# Altium footprint library Connector_PinHeader_2.54mm.PcbLib: 278 footprints (part 12 of 18)
Each footprint in its own frame and in the unit in brackets; x right, y up, seen from the top. Pads: shape width x height; smd on the part's side, far side on the other; paste and mask are expansions set on the pad; w line width, h text height; cw(c..) or ccw(c..) is an arc to the next point about the centre after c.
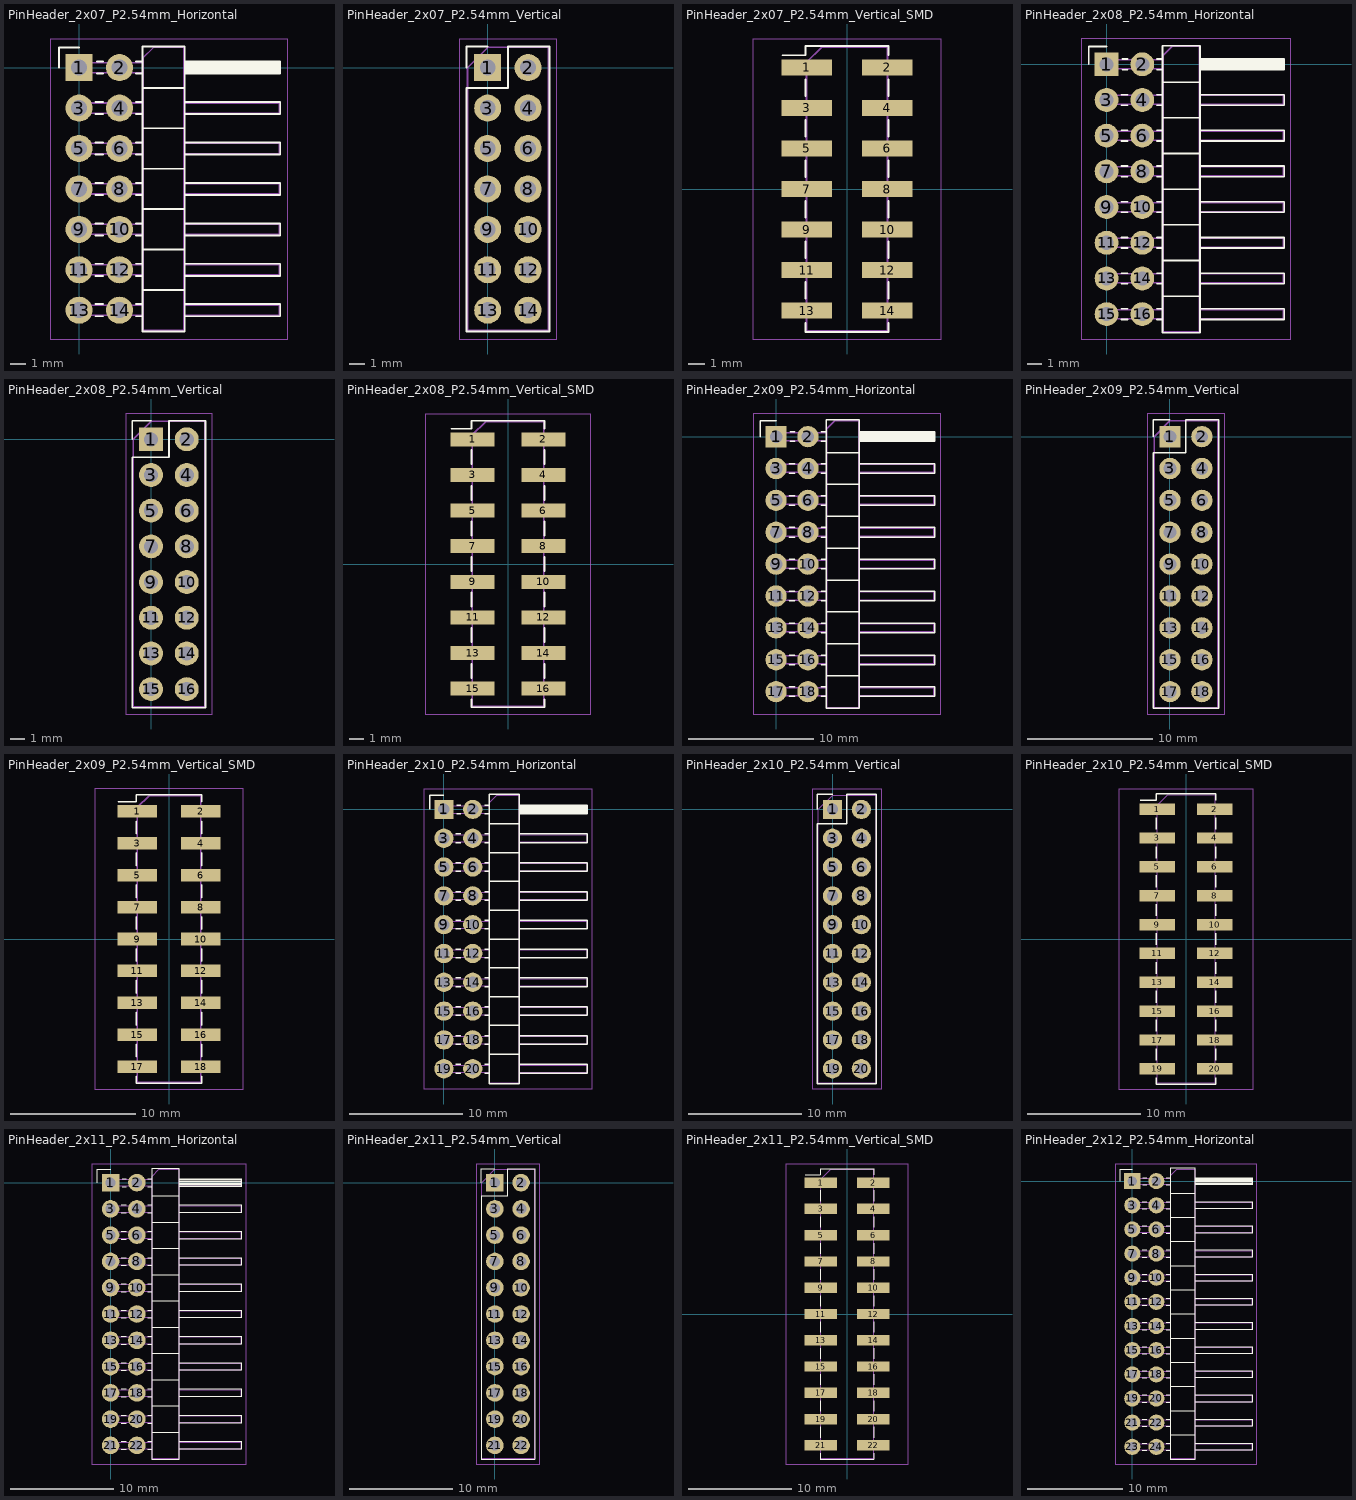
[diagram p11: the footprints below, top view; thin cyan lines are the x and y axes]

## PinHeader_2x07_P2.54mm_Horizontal [mm]
pads (14):
  rect 1.7x1.7 hole 1: 1(0,0)
  rrect100% 1.7x1.7 hole 1: 2(2.54,0) 3(0,-2.54) 4(2.54,-2.54) 5(0,-5.08) 6(2.54,-5.08) 7(0,-7.62) 8(2.54,-7.62) 9(0,-10.16) 10(2.54,-10.16) 11(0,-12.7) 12(2.54,-12.7) 13(0,-15.24) 14(2.54,-15.24)
F.SilkS:
  lines w0.12: -1.27,0 -1.27,1.27 0,1.27 ; 1.043,-15.62 1.497,-15.62 ; 1.043,-14.86 1.497,-14.86 ; 1.043,-13.08 1.497,-13.08 ; 1.043,-12.32 1.497,-12.32 ; 1.043,-10.54 1.497,-10.54 ; 1.043,-9.78 1.497,-9.78 ; 1.043,-8 1.497,-8 ; 1.043,-7.24 1.497,-7.24 ; 1.043,-5.46 1.497,-5.46 ; 1.043,-4.7 1.497,-4.7 ; 1.043,-2.92 1.497,-2.92 ; 1.043,-2.16 1.497,-2.16 ; 1.11,-0.38 1.497,-0.38 ; 1.11,0.38 1.497,0.38 ; 3.583,-15.62 3.98,-15.62 ; 3.583,-14.86 3.98,-14.86 ; 3.583,-13.08 3.98,-13.08 ; 3.583,-12.32 3.98,-12.32 ; 3.583,-10.54 3.98,-10.54 ; 3.583,-9.78 3.98,-9.78 ; 3.583,-8 3.98,-8 ; 3.583,-7.24 3.98,-7.24 ; 3.583,-5.46 3.98,-5.46 ; 3.583,-4.7 3.98,-4.7 ; 3.583,-2.92 3.98,-2.92 ; 3.583,-2.16 3.98,-2.16 ; 3.583,-0.38 3.98,-0.38 ; 3.583,0.38 3.98,0.38 ; 3.98,-13.97 6.64,-13.97 ; 3.98,-11.43 6.64,-11.43 ; 3.98,-8.89 6.64,-8.89 ; 3.98,-6.35 6.64,-6.35 ; 3.98,-3.81 6.64,-3.81 ; 3.98,-1.27 6.64,-1.27 ; 6.64,-15.62 12.64,-15.62 12.64,-14.86 6.64,-14.86 ; 6.64,-13.08 12.64,-13.08 12.64,-12.32 6.64,-12.32 ; 6.64,-10.54 12.64,-10.54 12.64,-9.78 6.64,-9.78 ; 6.64,-8 12.64,-8 12.64,-7.24 6.64,-7.24 ; 6.64,-5.46 12.64,-5.46 12.64,-4.7 6.64,-4.7 ; 6.64,-2.92 12.64,-2.92 12.64,-2.16 6.64,-2.16 ; 6.64,-0.38 12.64,-0.38 12.64,0.38 6.64,0.38 ; 6.64,-0.28 12.64,-0.28 ; 6.64,-0.16 12.64,-0.16 ; 6.64,-0.04 12.64,-0.04 ; 6.64,0.08 12.64,0.08 ; 6.64,0.2 12.64,0.2 ; 6.64,0.32 12.64,0.32 ; 3.98,-16.57 3.98,1.33 6.64,1.33 6.64,-16.57 3.98,-16.57
F.CrtYd:
  lines w0.05: -1.8,-17.05 13.1,-17.05 13.1,1.8 -1.8,1.8 -1.8,-17.05
F.Fab:
  lines w0.1: 4.04,-15.56 -0.32,-15.56 -0.32,-14.92 4.04,-14.92 ; 4.04,-13.02 -0.32,-13.02 -0.32,-12.38 4.04,-12.38 ; 4.04,-10.48 -0.32,-10.48 -0.32,-9.84 4.04,-9.84 ; 4.04,-7.94 -0.32,-7.94 -0.32,-7.3 4.04,-7.3 ; 4.04,-5.4 -0.32,-5.4 -0.32,-4.76 4.04,-4.76 ; 4.04,-2.86 -0.32,-2.86 -0.32,-2.22 4.04,-2.22 ; 4.04,-0.32 -0.32,-0.32 -0.32,0.32 4.04,0.32 ; 6.58,-15.56 12.58,-15.56 12.58,-14.92 6.58,-14.92 ; 6.58,-13.02 12.58,-13.02 12.58,-12.38 6.58,-12.38 ; 6.58,-10.48 12.58,-10.48 12.58,-9.84 6.58,-9.84 ; 6.58,-7.94 12.58,-7.94 12.58,-7.3 6.58,-7.3 ; 6.58,-5.4 12.58,-5.4 12.58,-4.76 6.58,-4.76 ; 6.58,-2.86 12.58,-2.86 12.58,-2.22 6.58,-2.22 ; 6.58,-0.32 12.58,-0.32 12.58,0.32 6.58,0.32 ; 4.04,-16.51 6.58,-16.51 6.58,1.27 4.675,1.27 4.04,0.635 4.04,-16.51
  text "'.Designator'" at 6.15,-11.667 h1

## PinHeader_2x07_P2.54mm_Vertical [mm]
pads (14):
  rect 1.7x1.7 hole 1: 1(0,0)
  rrect100% 1.7x1.7 hole 1: 2(2.54,0) 3(0,-2.54) 4(2.54,-2.54) 5(0,-5.08) 6(2.54,-5.08) 7(0,-7.62) 8(2.54,-7.62) 9(0,-10.16) 10(2.54,-10.16) 11(0,-12.7) 12(2.54,-12.7) 13(0,-15.24) 14(2.54,-15.24)
F.SilkS:
  lines w0.12: -1.33,0 -1.33,1.33 0,1.33 ; -1.33,-16.57 3.87,-16.57 3.87,1.33 1.27,1.33 1.27,-1.27 -1.33,-1.27 -1.33,-16.57
F.CrtYd:
  lines w0.05: -1.8,-17.05 -1.8,1.8 4.35,1.8 4.35,-17.05 -1.8,-17.05
F.Fab:
  lines w0.1: -1.27,-16.51 -1.27,0 0,1.27 3.81,1.27 3.81,-16.51 -1.27,-16.51
  text "'.Designator'" at 2.11,-11.667 h1

## PinHeader_2x07_P2.54mm_Vertical_SMD [mm]
pads (14):
  rect 3.15x1 smd: 1(-2.525,7.62) 2(2.525,7.62) 3(-2.525,5.08) 4(2.525,5.08) 5(-2.525,2.54) 6(2.525,2.54) 7(-2.525,0) 8(2.525,0) 9(-2.525,-2.54) 10(2.525,-2.54) 11(-2.525,-5.08) 12(2.525,-5.08) 13(-2.525,-7.62) 14(2.525,-7.62)
F.SilkS:
  lines w0.12: -4.04,8.38 -2.6,8.38 -2.6,8.95 2.6,8.95 2.6,8.38 ; -2.6,-8.38 -2.6,-8.95 2.6,-8.95 2.6,-8.38 ; -2.6,-6.86 -2.6,-5.84 ; -2.6,-4.32 -2.6,-3.3 ; -2.6,-1.78 -2.6,-0.76 ; -2.6,0.76 -2.6,1.78 ; -2.6,3.3 -2.6,4.32 ; -2.6,5.84 -2.6,6.86 ; 2.6,-6.86 2.6,-5.84 ; 2.6,-4.32 2.6,-3.3 ; 2.6,-1.78 2.6,-0.76 ; 2.6,0.76 2.6,1.78 ; 2.6,3.3 2.6,4.32 ; 2.6,5.84 2.6,6.86
F.CrtYd:
  lines w0.05: -5.9,-9.4 -5.9,9.4 5.9,9.4 5.9,-9.4 -5.9,-9.4
F.Fab:
  lines w0.1: -2.54,-7.94 -3.6,-7.94 -3.6,-7.3 -2.54,-7.3 ; -2.54,-5.4 -3.6,-5.4 -3.6,-4.76 -2.54,-4.76 ; -2.54,-2.86 -3.6,-2.86 -3.6,-2.22 -2.54,-2.22 ; -2.54,-0.32 -3.6,-0.32 -3.6,0.32 -2.54,0.32 ; -2.54,2.22 -3.6,2.22 -3.6,2.86 -2.54,2.86 ; -2.54,4.76 -3.6,4.76 -3.6,5.4 -2.54,5.4 ; -2.54,7.3 -3.6,7.3 -3.6,7.94 -2.54,7.94 ; 2.54,-7.94 3.6,-7.94 3.6,-7.3 2.54,-7.3 ; 2.54,-5.4 3.6,-5.4 3.6,-4.76 2.54,-4.76 ; 2.54,-2.86 3.6,-2.86 3.6,-2.22 2.54,-2.22 ; 2.54,-0.32 3.6,-0.32 3.6,0.32 2.54,0.32 ; 2.54,2.22 3.6,2.22 3.6,2.86 2.54,2.86 ; 2.54,4.76 3.6,4.76 3.6,5.4 2.54,5.4 ; 2.54,7.3 3.6,7.3 3.6,7.94 2.54,7.94 ; -2.54,7.94 -1.59,8.89 2.54,8.89 2.54,-8.89 -2.54,-8.89 -2.54,7.94
  text "'.Designator'" at 0.84,-4.047 h1

## PinHeader_2x08_P2.54mm_Horizontal [mm]
pads (16):
  rect 1.7x1.7 hole 1: 1(0,0)
  rrect100% 1.7x1.7 hole 1: 2(2.54,0) 3(0,-2.54) 4(2.54,-2.54) 5(0,-5.08) 6(2.54,-5.08) 7(0,-7.62) 8(2.54,-7.62) 9(0,-10.16) 10(2.54,-10.16) 11(0,-12.7) 12(2.54,-12.7) 13(0,-15.24) 14(2.54,-15.24) 15(0,-17.78) 16(2.54,-17.78)
F.SilkS:
  lines w0.12: -1.27,0 -1.27,1.27 0,1.27 ; 1.043,-18.16 1.497,-18.16 ; 1.043,-17.4 1.497,-17.4 ; 1.043,-15.62 1.497,-15.62 ; 1.043,-14.86 1.497,-14.86 ; 1.043,-13.08 1.497,-13.08 ; 1.043,-12.32 1.497,-12.32 ; 1.043,-10.54 1.497,-10.54 ; 1.043,-9.78 1.497,-9.78 ; 1.043,-8 1.497,-8 ; 1.043,-7.24 1.497,-7.24 ; 1.043,-5.46 1.497,-5.46 ; 1.043,-4.7 1.497,-4.7 ; 1.043,-2.92 1.497,-2.92 ; 1.043,-2.16 1.497,-2.16 ; 1.11,-0.38 1.497,-0.38 ; 1.11,0.38 1.497,0.38 ; 3.583,-18.16 3.98,-18.16 ; 3.583,-17.4 3.98,-17.4 ; 3.583,-15.62 3.98,-15.62 ; 3.583,-14.86 3.98,-14.86 ; 3.583,-13.08 3.98,-13.08 ; 3.583,-12.32 3.98,-12.32 ; 3.583,-10.54 3.98,-10.54 ; 3.583,-9.78 3.98,-9.78 ; 3.583,-8 3.98,-8 ; 3.583,-7.24 3.98,-7.24 ; 3.583,-5.46 3.98,-5.46 ; 3.583,-4.7 3.98,-4.7 ; 3.583,-2.92 3.98,-2.92 ; 3.583,-2.16 3.98,-2.16 ; 3.583,-0.38 3.98,-0.38 ; 3.583,0.38 3.98,0.38 ; 3.98,-16.51 6.64,-16.51 ; 3.98,-13.97 6.64,-13.97 ; 3.98,-11.43 6.64,-11.43 ; 3.98,-8.89 6.64,-8.89 ; 3.98,-6.35 6.64,-6.35 ; 3.98,-3.81 6.64,-3.81 ; 3.98,-1.27 6.64,-1.27 ; 6.64,-18.16 12.64,-18.16 12.64,-17.4 6.64,-17.4 ; 6.64,-15.62 12.64,-15.62 12.64,-14.86 6.64,-14.86 ; 6.64,-13.08 12.64,-13.08 12.64,-12.32 6.64,-12.32 ; 6.64,-10.54 12.64,-10.54 12.64,-9.78 6.64,-9.78 ; 6.64,-8 12.64,-8 12.64,-7.24 6.64,-7.24 ; 6.64,-5.46 12.64,-5.46 12.64,-4.7 6.64,-4.7 ; 6.64,-2.92 12.64,-2.92 12.64,-2.16 6.64,-2.16 ; 6.64,-0.38 12.64,-0.38 12.64,0.38 6.64,0.38 ; 6.64,-0.28 12.64,-0.28 ; 6.64,-0.16 12.64,-0.16 ; 6.64,-0.04 12.64,-0.04 ; 6.64,0.08 12.64,0.08 ; 6.64,0.2 12.64,0.2 ; 6.64,0.32 12.64,0.32 ; 3.98,-19.11 6.64,-19.11 6.64,1.33 3.98,1.33 3.98,-19.11
F.CrtYd:
  lines w0.05: -1.8,-19.55 13.1,-19.55 13.1,1.8 -1.8,1.8 -1.8,-19.55
F.Fab:
  lines w0.1: 4.04,-18.1 -0.32,-18.1 -0.32,-17.46 4.04,-17.46 ; 4.04,-15.56 -0.32,-15.56 -0.32,-14.92 4.04,-14.92 ; 4.04,-13.02 -0.32,-13.02 -0.32,-12.38 4.04,-12.38 ; 4.04,-10.48 -0.32,-10.48 -0.32,-9.84 4.04,-9.84 ; 4.04,-7.94 -0.32,-7.94 -0.32,-7.3 4.04,-7.3 ; 4.04,-5.4 -0.32,-5.4 -0.32,-4.76 4.04,-4.76 ; 4.04,-2.86 -0.32,-2.86 -0.32,-2.22 4.04,-2.22 ; 4.04,-0.32 -0.32,-0.32 -0.32,0.32 4.04,0.32 ; 6.58,-18.1 12.58,-18.1 12.58,-17.46 6.58,-17.46 ; 6.58,-15.56 12.58,-15.56 12.58,-14.92 6.58,-14.92 ; 6.58,-13.02 12.58,-13.02 12.58,-12.38 6.58,-12.38 ; 6.58,-10.48 12.58,-10.48 12.58,-9.84 6.58,-9.84 ; 6.58,-7.94 12.58,-7.94 12.58,-7.3 6.58,-7.3 ; 6.58,-5.4 12.58,-5.4 12.58,-4.76 6.58,-4.76 ; 6.58,-2.86 12.58,-2.86 12.58,-2.22 6.58,-2.22 ; 6.58,-0.32 12.58,-0.32 12.58,0.32 6.58,0.32 ; 4.04,-19.05 6.58,-19.05 6.58,1.27 4.675,1.27 4.04,0.635 4.04,-19.05
  text "'.Designator'" at 6.15,-12.937 h1

## PinHeader_2x08_P2.54mm_Vertical [mm]
pads (16):
  rect 1.7x1.7 hole 1: 1(0,0)
  rrect100% 1.7x1.7 hole 1: 2(2.54,0) 3(0,-2.54) 4(2.54,-2.54) 5(0,-5.08) 6(2.54,-5.08) 7(0,-7.62) 8(2.54,-7.62) 9(0,-10.16) 10(2.54,-10.16) 11(0,-12.7) 12(2.54,-12.7) 13(0,-15.24) 14(2.54,-15.24) 15(0,-17.78) 16(2.54,-17.78)
F.SilkS:
  lines w0.12: -1.33,0 -1.33,1.33 0,1.33 ; -1.33,-19.11 -1.33,-1.27 1.27,-1.27 1.27,1.33 3.87,1.33 3.87,-19.11 -1.33,-19.11
F.CrtYd:
  lines w0.05: -1.8,-19.55 4.35,-19.55 4.35,1.8 -1.8,1.8 -1.8,-19.55
F.Fab:
  lines w0.1: -1.27,-19.05 3.81,-19.05 3.81,1.27 0,1.27 -1.27,0 -1.27,-19.05
  text "'.Designator'" at 2.11,-12.937 h1

## PinHeader_2x08_P2.54mm_Vertical_SMD [mm]
pads (16):
  rect 3.15x1 smd: 1(-2.525,8.89) 2(2.525,8.89) 3(-2.525,6.35) 4(2.525,6.35) 5(-2.525,3.81) 6(2.525,3.81) 7(-2.525,1.27) 8(2.525,1.27) 9(-2.525,-1.27) 10(2.525,-1.27) 11(-2.525,-3.81) 12(2.525,-3.81) 13(-2.525,-6.35) 14(2.525,-6.35) 15(-2.525,-8.89) 16(2.525,-8.89)
F.SilkS:
  lines w0.12: -4.04,9.65 -2.6,9.65 -2.6,10.22 2.6,10.22 2.6,9.65 ; -2.6,-9.65 -2.6,-10.22 2.6,-10.22 2.6,-9.65 ; -2.6,-8.13 -2.6,-7.11 ; -2.6,-5.59 -2.6,-4.57 ; -2.6,-3.05 -2.6,-2.03 ; -2.6,-0.51 -2.6,0.51 ; -2.6,2.03 -2.6,3.05 ; -2.6,4.57 -2.6,5.59 ; -2.6,7.11 -2.6,8.13 ; 2.6,-8.13 2.6,-7.11 ; 2.6,-5.59 2.6,-4.57 ; 2.6,-3.05 2.6,-2.03 ; 2.6,-0.51 2.6,0.51 ; 2.6,2.03 2.6,3.05 ; 2.6,4.57 2.6,5.59 ; 2.6,7.11 2.6,8.13
F.CrtYd:
  lines w0.05: -5.9,-10.7 -5.9,10.7 5.9,10.7 5.9,-10.7 -5.9,-10.7
F.Fab:
  lines w0.1: -2.54,-9.21 -3.6,-9.21 -3.6,-8.57 -2.54,-8.57 ; -2.54,-6.67 -3.6,-6.67 -3.6,-6.03 -2.54,-6.03 ; -2.54,-4.13 -3.6,-4.13 -3.6,-3.49 -2.54,-3.49 ; -2.54,-1.59 -3.6,-1.59 -3.6,-0.95 -2.54,-0.95 ; -2.54,0.95 -3.6,0.95 -3.6,1.59 -2.54,1.59 ; -2.54,3.49 -3.6,3.49 -3.6,4.13 -2.54,4.13 ; -2.54,6.03 -3.6,6.03 -3.6,6.67 -2.54,6.67 ; -2.54,8.57 -3.6,8.57 -3.6,9.21 -2.54,9.21 ; 2.54,-9.21 3.6,-9.21 3.6,-8.57 2.54,-8.57 ; 2.54,-6.67 3.6,-6.67 3.6,-6.03 2.54,-6.03 ; 2.54,-4.13 3.6,-4.13 3.6,-3.49 2.54,-3.49 ; 2.54,-1.59 3.6,-1.59 3.6,-0.95 2.54,-0.95 ; 2.54,0.95 3.6,0.95 3.6,1.59 2.54,1.59 ; 2.54,3.49 3.6,3.49 3.6,4.13 2.54,4.13 ; 2.54,6.03 3.6,6.03 3.6,6.67 2.54,6.67 ; 2.54,8.57 3.6,8.57 3.6,9.21 2.54,9.21 ; -2.54,9.21 -1.59,10.16 2.54,10.16 2.54,-10.16 -2.54,-10.16 -2.54,9.21
  text "'.Designator'" at 0.84,-4.047 h1

## PinHeader_2x09_P2.54mm_Horizontal [mm]
pads (18):
  rect 1.7x1.7 hole 1: 1(0,0)
  rrect100% 1.7x1.7 hole 1: 2(2.54,0) 3(0,-2.54) 4(2.54,-2.54) 5(0,-5.08) 6(2.54,-5.08) 7(0,-7.62) 8(2.54,-7.62) 9(0,-10.16) 10(2.54,-10.16) 11(0,-12.7) 12(2.54,-12.7) 13(0,-15.24) 14(2.54,-15.24) 15(0,-17.78) 16(2.54,-17.78) 17(0,-20.32) 18(2.54,-20.32)
F.SilkS:
  lines w0.12: -1.27,0 -1.27,1.27 0,1.27 ; 1.043,-20.7 1.497,-20.7 ; 1.043,-19.94 1.497,-19.94 ; 1.043,-18.16 1.497,-18.16 ; 1.043,-17.4 1.497,-17.4 ; 1.043,-15.62 1.497,-15.62 ; 1.043,-14.86 1.497,-14.86 ; 1.043,-13.08 1.497,-13.08 ; 1.043,-12.32 1.497,-12.32 ; 1.043,-10.54 1.497,-10.54 ; 1.043,-9.78 1.497,-9.78 ; 1.043,-8 1.497,-8 ; 1.043,-7.24 1.497,-7.24 ; 1.043,-5.46 1.497,-5.46 ; 1.043,-4.7 1.497,-4.7 ; 1.043,-2.92 1.497,-2.92 ; 1.043,-2.16 1.497,-2.16 ; 1.11,-0.38 1.497,-0.38 ; 1.11,0.38 1.497,0.38 ; 3.583,-20.7 3.98,-20.7 ; 3.583,-19.94 3.98,-19.94 ; 3.583,-18.16 3.98,-18.16 ; 3.583,-17.4 3.98,-17.4 ; 3.583,-15.62 3.98,-15.62 ; 3.583,-14.86 3.98,-14.86 ; 3.583,-13.08 3.98,-13.08 ; 3.583,-12.32 3.98,-12.32 ; 3.583,-10.54 3.98,-10.54 ; 3.583,-9.78 3.98,-9.78 ; 3.583,-8 3.98,-8 ; 3.583,-7.24 3.98,-7.24 ; 3.583,-5.46 3.98,-5.46 ; 3.583,-4.7 3.98,-4.7 ; 3.583,-2.92 3.98,-2.92 ; 3.583,-2.16 3.98,-2.16 ; 3.583,-0.38 3.98,-0.38 ; 3.583,0.38 3.98,0.38 ; 3.98,-19.05 6.64,-19.05 ; 3.98,-16.51 6.64,-16.51 ; 3.98,-13.97 6.64,-13.97 ; 3.98,-11.43 6.64,-11.43 ; 3.98,-8.89 6.64,-8.89 ; 3.98,-6.35 6.64,-6.35 ; 3.98,-3.81 6.64,-3.81 ; 3.98,-1.27 6.64,-1.27 ; 6.64,-20.7 12.64,-20.7 12.64,-19.94 6.64,-19.94 ; 6.64,-18.16 12.64,-18.16 12.64,-17.4 6.64,-17.4 ; 6.64,-15.62 12.64,-15.62 12.64,-14.86 6.64,-14.86 ; 6.64,-13.08 12.64,-13.08 12.64,-12.32 6.64,-12.32 ; 6.64,-10.54 12.64,-10.54 12.64,-9.78 6.64,-9.78 ; 6.64,-8 12.64,-8 12.64,-7.24 6.64,-7.24 ; 6.64,-5.46 12.64,-5.46 12.64,-4.7 6.64,-4.7 ; 6.64,-2.92 12.64,-2.92 12.64,-2.16 6.64,-2.16 ; 6.64,-0.38 12.64,-0.38 12.64,0.38 6.64,0.38 ; 6.64,-0.28 12.64,-0.28 ; 6.64,-0.16 12.64,-0.16 ; 6.64,-0.04 12.64,-0.04 ; 6.64,0.08 12.64,0.08 ; 6.64,0.2 12.64,0.2 ; 6.64,0.32 12.64,0.32 ; 3.98,-21.65 3.98,1.33 6.64,1.33 6.64,-21.65 3.98,-21.65
F.CrtYd:
  lines w0.05: -1.8,-22.1 13.1,-22.1 13.1,1.8 -1.8,1.8 -1.8,-22.1
F.Fab:
  lines w0.1: 4.04,-20.64 -0.32,-20.64 -0.32,-20 4.04,-20 ; 4.04,-18.1 -0.32,-18.1 -0.32,-17.46 4.04,-17.46 ; 4.04,-15.56 -0.32,-15.56 -0.32,-14.92 4.04,-14.92 ; 4.04,-13.02 -0.32,-13.02 -0.32,-12.38 4.04,-12.38 ; 4.04,-10.48 -0.32,-10.48 -0.32,-9.84 4.04,-9.84 ; 4.04,-7.94 -0.32,-7.94 -0.32,-7.3 4.04,-7.3 ; 4.04,-5.4 -0.32,-5.4 -0.32,-4.76 4.04,-4.76 ; 4.04,-2.86 -0.32,-2.86 -0.32,-2.22 4.04,-2.22 ; 4.04,-0.32 -0.32,-0.32 -0.32,0.32 4.04,0.32 ; 6.58,-20.64 12.58,-20.64 12.58,-20 6.58,-20 ; 6.58,-18.1 12.58,-18.1 12.58,-17.46 6.58,-17.46 ; 6.58,-15.56 12.58,-15.56 12.58,-14.92 6.58,-14.92 ; 6.58,-13.02 12.58,-13.02 12.58,-12.38 6.58,-12.38 ; 6.58,-10.48 12.58,-10.48 12.58,-9.84 6.58,-9.84 ; 6.58,-7.94 12.58,-7.94 12.58,-7.3 6.58,-7.3 ; 6.58,-5.4 12.58,-5.4 12.58,-4.76 6.58,-4.76 ; 6.58,-2.86 12.58,-2.86 12.58,-2.22 6.58,-2.22 ; 6.58,-0.32 12.58,-0.32 12.58,0.32 6.58,0.32 ; 4.04,-21.59 4.04,0.635 4.675,1.27 6.58,1.27 6.58,-21.59 4.04,-21.59
  text "'.Designator'" at 6.15,-14.207 h1

## PinHeader_2x09_P2.54mm_Vertical [mm]
pads (18):
  rect 1.7x1.7 hole 1: 1(0,0)
  rrect100% 1.7x1.7 hole 1: 2(2.54,0) 3(0,-2.54) 4(2.54,-2.54) 5(0,-5.08) 6(2.54,-5.08) 7(0,-7.62) 8(2.54,-7.62) 9(0,-10.16) 10(2.54,-10.16) 11(0,-12.7) 12(2.54,-12.7) 13(0,-15.24) 14(2.54,-15.24) 15(0,-17.78) 16(2.54,-17.78) 17(0,-20.32) 18(2.54,-20.32)
F.SilkS:
  lines w0.12: -1.33,0 -1.33,1.33 0,1.33 ; -1.33,-21.65 3.87,-21.65 3.87,1.33 1.27,1.33 1.27,-1.27 -1.33,-1.27 -1.33,-21.65
F.CrtYd:
  lines w0.05: -1.8,-22.1 4.35,-22.1 4.35,1.8 -1.8,1.8 -1.8,-22.1
F.Fab:
  lines w0.1: -1.27,-21.59 -1.27,0 0,1.27 3.81,1.27 3.81,-21.59 -1.27,-21.59
  text "'.Designator'" at 2.11,-14.207 h1

## PinHeader_2x09_P2.54mm_Vertical_SMD [mm]
pads (18):
  rect 3.15x1 smd: 1(-2.525,10.16) 2(2.525,10.16) 3(-2.525,7.62) 4(2.525,7.62) 5(-2.525,5.08) 6(2.525,5.08) 7(-2.525,2.54) 8(2.525,2.54) 9(-2.525,0) 10(2.525,0) 11(-2.525,-2.54) 12(2.525,-2.54) 13(-2.525,-5.08) 14(2.525,-5.08) 15(-2.525,-7.62) 16(2.525,-7.62) 17(-2.525,-10.16) 18(2.525,-10.16)
F.SilkS:
  lines w0.12: -4.04,10.92 -2.6,10.92 -2.6,11.49 2.6,11.49 2.6,10.92 ; -2.6,-10.92 -2.6,-11.49 2.6,-11.49 2.6,-10.92 ; -2.6,-9.4 -2.6,-8.38 ; -2.6,-6.86 -2.6,-5.84 ; -2.6,-4.32 -2.6,-3.3 ; -2.6,-1.78 -2.6,-0.76 ; -2.6,0.76 -2.6,1.78 ; -2.6,3.3 -2.6,4.32 ; -2.6,5.84 -2.6,6.86 ; -2.6,8.38 -2.6,9.4 ; 2.6,-9.4 2.6,-8.38 ; 2.6,-6.86 2.6,-5.84 ; 2.6,-4.32 2.6,-3.3 ; 2.6,-1.78 2.6,-0.76 ; 2.6,0.76 2.6,1.78 ; 2.6,3.3 2.6,4.32 ; 2.6,5.84 2.6,6.86 ; 2.6,8.38 2.6,9.4
F.CrtYd:
  lines w0.05: -5.9,-11.95 -5.9,11.95 5.9,11.95 5.9,-11.95 -5.9,-11.95
F.Fab:
  lines w0.1: -2.54,-10.48 -3.6,-10.48 -3.6,-9.84 -2.54,-9.84 ; -2.54,-7.94 -3.6,-7.94 -3.6,-7.3 -2.54,-7.3 ; -2.54,-5.4 -3.6,-5.4 -3.6,-4.76 -2.54,-4.76 ; -2.54,-2.86 -3.6,-2.86 -3.6,-2.22 -2.54,-2.22 ; -2.54,-0.32 -3.6,-0.32 -3.6,0.32 -2.54,0.32 ; -2.54,2.22 -3.6,2.22 -3.6,2.86 -2.54,2.86 ; -2.54,4.76 -3.6,4.76 -3.6,5.4 -2.54,5.4 ; -2.54,7.3 -3.6,7.3 -3.6,7.94 -2.54,7.94 ; -2.54,9.84 -3.6,9.84 -3.6,10.48 -2.54,10.48 ; 2.54,-10.48 3.6,-10.48 3.6,-9.84 2.54,-9.84 ; 2.54,-7.94 3.6,-7.94 3.6,-7.3 2.54,-7.3 ; 2.54,-5.4 3.6,-5.4 3.6,-4.76 2.54,-4.76 ; 2.54,-2.86 3.6,-2.86 3.6,-2.22 2.54,-2.22 ; 2.54,-0.32 3.6,-0.32 3.6,0.32 2.54,0.32 ; 2.54,2.22 3.6,2.22 3.6,2.86 2.54,2.86 ; 2.54,4.76 3.6,4.76 3.6,5.4 2.54,5.4 ; 2.54,7.3 3.6,7.3 3.6,7.94 2.54,7.94 ; 2.54,9.84 3.6,9.84 3.6,10.48 2.54,10.48 ; -2.54,10.48 -1.59,11.43 2.54,11.43 2.54,-11.43 -2.54,-11.43 -2.54,10.48
  text "'.Designator'" at 0.84,-4.047 h1

## PinHeader_2x10_P2.54mm_Horizontal [mm]
pads (20):
  rect 1.7x1.7 hole 1: 1(0,0)
  rrect100% 1.7x1.7 hole 1: 2(2.54,0) 3(0,-2.54) 4(2.54,-2.54) 5(0,-5.08) 6(2.54,-5.08) 7(0,-7.62) 8(2.54,-7.62) 9(0,-10.16) 10(2.54,-10.16) 11(0,-12.7) 12(2.54,-12.7) 13(0,-15.24) 14(2.54,-15.24) 15(0,-17.78) 16(2.54,-17.78) 17(0,-20.32) 18(2.54,-20.32) 19(0,-22.86) 20(2.54,-22.86)
F.SilkS:
  lines w0.12: -1.27,0 -1.27,1.27 0,1.27 ; 1.043,-23.24 1.497,-23.24 ; 1.043,-22.48 1.497,-22.48 ; 1.043,-20.7 1.497,-20.7 ; 1.043,-19.94 1.497,-19.94 ; 1.043,-18.16 1.497,-18.16 ; 1.043,-17.4 1.497,-17.4 ; 1.043,-15.62 1.497,-15.62 ; 1.043,-14.86 1.497,-14.86 ; 1.043,-13.08 1.497,-13.08 ; 1.043,-12.32 1.497,-12.32 ; 1.043,-10.54 1.497,-10.54 ; 1.043,-9.78 1.497,-9.78 ; 1.043,-8 1.497,-8 ; 1.043,-7.24 1.497,-7.24 ; 1.043,-5.46 1.497,-5.46 ; 1.043,-4.7 1.497,-4.7 ; 1.043,-2.92 1.497,-2.92 ; 1.043,-2.16 1.497,-2.16 ; 1.11,-0.38 1.497,-0.38 ; 1.11,0.38 1.497,0.38 ; 3.583,-23.24 3.98,-23.24 ; 3.583,-22.48 3.98,-22.48 ; 3.583,-20.7 3.98,-20.7 ; 3.583,-19.94 3.98,-19.94 ; 3.583,-18.16 3.98,-18.16 ; 3.583,-17.4 3.98,-17.4 ; 3.583,-15.62 3.98,-15.62 ; 3.583,-14.86 3.98,-14.86 ; 3.583,-13.08 3.98,-13.08 ; 3.583,-12.32 3.98,-12.32 ; 3.583,-10.54 3.98,-10.54 ; 3.583,-9.78 3.98,-9.78 ; 3.583,-8 3.98,-8 ; 3.583,-7.24 3.98,-7.24 ; 3.583,-5.46 3.98,-5.46 ; 3.583,-4.7 3.98,-4.7 ; 3.583,-2.92 3.98,-2.92 ; 3.583,-2.16 3.98,-2.16 ; 3.583,-0.38 3.98,-0.38 ; 3.583,0.38 3.98,0.38 ; 3.98,-21.59 6.64,-21.59 ; 3.98,-19.05 6.64,-19.05 ; 3.98,-16.51 6.64,-16.51 ; 3.98,-13.97 6.64,-13.97 ; 3.98,-11.43 6.64,-11.43 ; 3.98,-8.89 6.64,-8.89 ; 3.98,-6.35 6.64,-6.35 ; 3.98,-3.81 6.64,-3.81 ; 3.98,-1.27 6.64,-1.27 ; 6.64,-23.24 12.64,-23.24 12.64,-22.48 6.64,-22.48 ; 6.64,-20.7 12.64,-20.7 12.64,-19.94 6.64,-19.94 ; 6.64,-18.16 12.64,-18.16 12.64,-17.4 6.64,-17.4 ; 6.64,-15.62 12.64,-15.62 12.64,-14.86 6.64,-14.86 ; 6.64,-13.08 12.64,-13.08 12.64,-12.32 6.64,-12.32 ; 6.64,-10.54 12.64,-10.54 12.64,-9.78 6.64,-9.78 ; 6.64,-8 12.64,-8 12.64,-7.24 6.64,-7.24 ; 6.64,-5.46 12.64,-5.46 12.64,-4.7 6.64,-4.7 ; 6.64,-2.92 12.64,-2.92 12.64,-2.16 6.64,-2.16 ; 6.64,-0.38 12.64,-0.38 12.64,0.38 6.64,0.38 ; 6.64,-0.28 12.64,-0.28 ; 6.64,-0.16 12.64,-0.16 ; 6.64,-0.04 12.64,-0.04 ; 6.64,0.08 12.64,0.08 ; 6.64,0.2 12.64,0.2 ; 6.64,0.32 12.64,0.32 ; 3.98,-24.19 6.64,-24.19 6.64,1.33 3.98,1.33 3.98,-24.19
F.CrtYd:
  lines w0.05: -1.8,-24.65 13.1,-24.65 13.1,1.8 -1.8,1.8 -1.8,-24.65
F.Fab:
  lines w0.1: 4.04,-23.18 -0.32,-23.18 -0.32,-22.54 4.04,-22.54 ; 4.04,-20.64 -0.32,-20.64 -0.32,-20 4.04,-20 ; 4.04,-18.1 -0.32,-18.1 -0.32,-17.46 4.04,-17.46 ; 4.04,-15.56 -0.32,-15.56 -0.32,-14.92 4.04,-14.92 ; 4.04,-13.02 -0.32,-13.02 -0.32,-12.38 4.04,-12.38 ; 4.04,-10.48 -0.32,-10.48 -0.32,-9.84 4.04,-9.84 ; 4.04,-7.94 -0.32,-7.94 -0.32,-7.3 4.04,-7.3 ; 4.04,-5.4 -0.32,-5.4 -0.32,-4.76 4.04,-4.76 ; 4.04,-2.86 -0.32,-2.86 -0.32,-2.22 4.04,-2.22 ; 4.04,-0.32 -0.32,-0.32 -0.32,0.32 4.04,0.32 ; 6.58,-23.18 12.58,-23.18 12.58,-22.54 6.58,-22.54 ; 6.58,-20.64 12.58,-20.64 12.58,-20 6.58,-20 ; 6.58,-18.1 12.58,-18.1 12.58,-17.46 6.58,-17.46 ; 6.58,-15.56 12.58,-15.56 12.58,-14.92 6.58,-14.92 ; 6.58,-13.02 12.58,-13.02 12.58,-12.38 6.58,-12.38 ; 6.58,-10.48 12.58,-10.48 12.58,-9.84 6.58,-9.84 ; 6.58,-7.94 12.58,-7.94 12.58,-7.3 6.58,-7.3 ; 6.58,-5.4 12.58,-5.4 12.58,-4.76 6.58,-4.76 ; 6.58,-2.86 12.58,-2.86 12.58,-2.22 6.58,-2.22 ; 6.58,-0.32 12.58,-0.32 12.58,0.32 6.58,0.32 ; 4.04,-24.13 4.04,0.635 4.675,1.27 6.58,1.27 6.58,-24.13 4.04,-24.13
  text "'.Designator'" at 6.15,-15.477 h1

## PinHeader_2x10_P2.54mm_Vertical [mm]
pads (20):
  rect 1.7x1.7 hole 1: 1(0,0)
  rrect100% 1.7x1.7 hole 1: 2(2.54,0) 3(0,-2.54) 4(2.54,-2.54) 5(0,-5.08) 6(2.54,-5.08) 7(0,-7.62) 8(2.54,-7.62) 9(0,-10.16) 10(2.54,-10.16) 11(0,-12.7) 12(2.54,-12.7) 13(0,-15.24) 14(2.54,-15.24) 15(0,-17.78) 16(2.54,-17.78) 17(0,-20.32) 18(2.54,-20.32) 19(0,-22.86) 20(2.54,-22.86)
F.SilkS:
  lines w0.12: -1.33,0 -1.33,1.33 0,1.33 ; -1.33,-24.19 3.87,-24.19 3.87,1.33 1.27,1.33 1.27,-1.27 -1.33,-1.27 -1.33,-24.19
F.CrtYd:
  lines w0.05: -1.8,-24.65 -1.8,1.8 4.35,1.8 4.35,-24.65 -1.8,-24.65
F.Fab:
  lines w0.1: -1.27,-24.13 -1.27,0 0,1.27 3.81,1.27 3.81,-24.13 -1.27,-24.13
  text "'.Designator'" at 2.11,-15.477 h1

## PinHeader_2x10_P2.54mm_Vertical_SMD [mm]
pads (20):
  rect 3.15x1 smd: 1(-2.525,11.43) 2(2.525,11.43) 3(-2.525,8.89) 4(2.525,8.89) 5(-2.525,6.35) 6(2.525,6.35) 7(-2.525,3.81) 8(2.525,3.81) 9(-2.525,1.27) 10(2.525,1.27) 11(-2.525,-1.27) 12(2.525,-1.27) 13(-2.525,-3.81) 14(2.525,-3.81) 15(-2.525,-6.35) 16(2.525,-6.35) 17(-2.525,-8.89) 18(2.525,-8.89) 19(-2.525,-11.43) 20(2.525,-11.43)
F.SilkS:
  lines w0.12: -4.04,12.19 -2.6,12.19 -2.6,12.76 2.6,12.76 2.6,12.19 ; -2.6,-12.19 -2.6,-12.76 2.6,-12.76 2.6,-12.19 ; -2.6,-10.67 -2.6,-9.65 ; -2.6,-8.13 -2.6,-7.11 ; -2.6,-5.59 -2.6,-4.57 ; -2.6,-3.05 -2.6,-2.03 ; -2.6,-0.51 -2.6,0.51 ; -2.6,2.03 -2.6,3.05 ; -2.6,4.57 -2.6,5.59 ; -2.6,7.11 -2.6,8.13 ; -2.6,9.65 -2.6,10.67 ; 2.6,-10.67 2.6,-9.65 ; 2.6,-8.13 2.6,-7.11 ; 2.6,-5.59 2.6,-4.57 ; 2.6,-3.05 2.6,-2.03 ; 2.6,-0.51 2.6,0.51 ; 2.6,2.03 2.6,3.05 ; 2.6,4.57 2.6,5.59 ; 2.6,7.11 2.6,8.13 ; 2.6,9.65 2.6,10.67
F.CrtYd:
  lines w0.05: -5.9,-13.2 5.9,-13.2 5.9,13.2 -5.9,13.2 -5.9,-13.2
F.Fab:
  lines w0.1: -2.54,-11.75 -3.6,-11.75 -3.6,-11.11 -2.54,-11.11 ; -2.54,-9.21 -3.6,-9.21 -3.6,-8.57 -2.54,-8.57 ; -2.54,-6.67 -3.6,-6.67 -3.6,-6.03 -2.54,-6.03 ; -2.54,-4.13 -3.6,-4.13 -3.6,-3.49 -2.54,-3.49 ; -2.54,-1.59 -3.6,-1.59 -3.6,-0.95 -2.54,-0.95 ; -2.54,0.95 -3.6,0.95 -3.6,1.59 -2.54,1.59 ; -2.54,3.49 -3.6,3.49 -3.6,4.13 -2.54,4.13 ; -2.54,6.03 -3.6,6.03 -3.6,6.67 -2.54,6.67 ; -2.54,8.57 -3.6,8.57 -3.6,9.21 -2.54,9.21 ; -2.54,11.11 -3.6,11.11 -3.6,11.75 -2.54,11.75 ; 2.54,-11.75 3.6,-11.75 3.6,-11.11 2.54,-11.11 ; 2.54,-9.21 3.6,-9.21 3.6,-8.57 2.54,-8.57 ; 2.54,-6.67 3.6,-6.67 3.6,-6.03 2.54,-6.03 ; 2.54,-4.13 3.6,-4.13 3.6,-3.49 2.54,-3.49 ; 2.54,-1.59 3.6,-1.59 3.6,-0.95 2.54,-0.95 ; 2.54,0.95 3.6,0.95 3.6,1.59 2.54,1.59 ; 2.54,3.49 3.6,3.49 3.6,4.13 2.54,4.13 ; 2.54,6.03 3.6,6.03 3.6,6.67 2.54,6.67 ; 2.54,8.57 3.6,8.57 3.6,9.21 2.54,9.21 ; 2.54,11.11 3.6,11.11 3.6,11.75 2.54,11.75 ; -2.54,11.75 -1.59,12.7 2.54,12.7 2.54,-12.7 -2.54,-12.7 -2.54,11.75
  text "'.Designator'" at 0.84,-4.047 h1

## PinHeader_2x11_P2.54mm_Horizontal [mm]
pads (22):
  rect 1.7x1.7 hole 1: 1(0,0)
  rrect100% 1.7x1.7 hole 1: 2(2.54,0) 3(0,-2.54) 4(2.54,-2.54) 5(0,-5.08) 6(2.54,-5.08) 7(0,-7.62) 8(2.54,-7.62) 9(0,-10.16) 10(2.54,-10.16) 11(0,-12.7) 12(2.54,-12.7) 13(0,-15.24) 14(2.54,-15.24) 15(0,-17.78) 16(2.54,-17.78) 17(0,-20.32) 18(2.54,-20.32) 19(0,-22.86) 20(2.54,-22.86) 21(0,-25.4) 22(2.54,-25.4)
F.SilkS:
  lines w0.12: -1.27,0 -1.27,1.27 0,1.27 ; 1.043,-25.78 1.497,-25.78 ; 1.043,-25.02 1.497,-25.02 ; 1.043,-23.24 1.497,-23.24 ; 1.043,-22.48 1.497,-22.48 ; 1.043,-20.7 1.497,-20.7 ; 1.043,-19.94 1.497,-19.94 ; 1.043,-18.16 1.497,-18.16 ; 1.043,-17.4 1.497,-17.4 ; 1.043,-15.62 1.497,-15.62 ; 1.043,-14.86 1.497,-14.86 ; 1.043,-13.08 1.497,-13.08 ; 1.043,-12.32 1.497,-12.32 ; 1.043,-10.54 1.497,-10.54 ; 1.043,-9.78 1.497,-9.78 ; 1.043,-8 1.497,-8 ; 1.043,-7.24 1.497,-7.24 ; 1.043,-5.46 1.497,-5.46 ; 1.043,-4.7 1.497,-4.7 ; 1.043,-2.92 1.497,-2.92 ; 1.043,-2.16 1.497,-2.16 ; 1.11,-0.38 1.497,-0.38 ; 1.11,0.38 1.497,0.38 ; 3.583,-25.78 3.98,-25.78 ; 3.583,-25.02 3.98,-25.02 ; 3.583,-23.24 3.98,-23.24 ; 3.583,-22.48 3.98,-22.48 ; 3.583,-20.7 3.98,-20.7 ; 3.583,-19.94 3.98,-19.94 ; 3.583,-18.16 3.98,-18.16 ; 3.583,-17.4 3.98,-17.4 ; 3.583,-15.62 3.98,-15.62 ; 3.583,-14.86 3.98,-14.86 ; 3.583,-13.08 3.98,-13.08 ; 3.583,-12.32 3.98,-12.32 ; 3.583,-10.54 3.98,-10.54 ; 3.583,-9.78 3.98,-9.78 ; 3.583,-8 3.98,-8 ; 3.583,-7.24 3.98,-7.24 ; 3.583,-5.46 3.98,-5.46 ; 3.583,-4.7 3.98,-4.7 ; 3.583,-2.92 3.98,-2.92 ; 3.583,-2.16 3.98,-2.16 ; 3.583,-0.38 3.98,-0.38 ; 3.583,0.38 3.98,0.38 ; 3.98,-24.13 6.64,-24.13 ; 3.98,-21.59 6.64,-21.59 ; 3.98,-19.05 6.64,-19.05 ; 3.98,-16.51 6.64,-16.51 ; 3.98,-13.97 6.64,-13.97 ; 3.98,-11.43 6.64,-11.43 ; 3.98,-8.89 6.64,-8.89 ; 3.98,-6.35 6.64,-6.35 ; 3.98,-3.81 6.64,-3.81 ; 3.98,-1.27 6.64,-1.27 ; 6.64,-25.78 12.64,-25.78 12.64,-25.02 6.64,-25.02 ; 6.64,-23.24 12.64,-23.24 12.64,-22.48 6.64,-22.48 ; 6.64,-20.7 12.64,-20.7 12.64,-19.94 6.64,-19.94 ; 6.64,-18.16 12.64,-18.16 12.64,-17.4 6.64,-17.4 ; 6.64,-15.62 12.64,-15.62 12.64,-14.86 6.64,-14.86 ; 6.64,-13.08 12.64,-13.08 12.64,-12.32 6.64,-12.32 ; 6.64,-10.54 12.64,-10.54 12.64,-9.78 6.64,-9.78 ; 6.64,-8 12.64,-8 12.64,-7.24 6.64,-7.24 ; 6.64,-5.46 12.64,-5.46 12.64,-4.7 6.64,-4.7 ; 6.64,-2.92 12.64,-2.92 12.64,-2.16 6.64,-2.16 ; 6.64,-0.38 12.64,-0.38 12.64,0.38 6.64,0.38 ; 6.64,-0.28 12.64,-0.28 ; 6.64,-0.16 12.64,-0.16 ; 6.64,-0.04 12.64,-0.04 ; 6.64,0.08 12.64,0.08 ; 6.64,0.2 12.64,0.2 ; 6.64,0.32 12.64,0.32 ; 3.98,-26.73 6.64,-26.73 6.64,1.33 3.98,1.33 3.98,-26.73
F.CrtYd:
  lines w0.05: -1.8,-27.2 13.1,-27.2 13.1,1.8 -1.8,1.8 -1.8,-27.2
F.Fab:
  lines w0.1: 4.04,-25.72 -0.32,-25.72 -0.32,-25.08 4.04,-25.08 ; 4.04,-23.18 -0.32,-23.18 -0.32,-22.54 4.04,-22.54 ; 4.04,-20.64 -0.32,-20.64 -0.32,-20 4.04,-20 ; 4.04,-18.1 -0.32,-18.1 -0.32,-17.46 4.04,-17.46 ; 4.04,-15.56 -0.32,-15.56 -0.32,-14.92 4.04,-14.92 ; 4.04,-13.02 -0.32,-13.02 -0.32,-12.38 4.04,-12.38 ; 4.04,-10.48 -0.32,-10.48 -0.32,-9.84 4.04,-9.84 ; 4.04,-7.94 -0.32,-7.94 -0.32,-7.3 4.04,-7.3 ; 4.04,-5.4 -0.32,-5.4 -0.32,-4.76 4.04,-4.76 ; 4.04,-2.86 -0.32,-2.86 -0.32,-2.22 4.04,-2.22 ; 4.04,-0.32 -0.32,-0.32 -0.32,0.32 4.04,0.32 ; 6.58,-25.72 12.58,-25.72 12.58,-25.08 6.58,-25.08 ; 6.58,-23.18 12.58,-23.18 12.58,-22.54 6.58,-22.54 ; 6.58,-20.64 12.58,-20.64 12.58,-20 6.58,-20 ; 6.58,-18.1 12.58,-18.1 12.58,-17.46 6.58,-17.46 ; 6.58,-15.56 12.58,-15.56 12.58,-14.92 6.58,-14.92 ; 6.58,-13.02 12.58,-13.02 12.58,-12.38 6.58,-12.38 ; 6.58,-10.48 12.58,-10.48 12.58,-9.84 6.58,-9.84 ; 6.58,-7.94 12.58,-7.94 12.58,-7.3 6.58,-7.3 ; 6.58,-5.4 12.58,-5.4 12.58,-4.76 6.58,-4.76 ; 6.58,-2.86 12.58,-2.86 12.58,-2.22 6.58,-2.22 ; 6.58,-0.32 12.58,-0.32 12.58,0.32 6.58,0.32 ; 4.04,-26.67 6.58,-26.67 6.58,1.27 4.675,1.27 4.04,0.635 4.04,-26.67
  text "'.Designator'" at 6.15,-16.747 h1

## PinHeader_2x11_P2.54mm_Vertical [mm]
pads (22):
  rect 1.7x1.7 hole 1: 1(0,0)
  rrect100% 1.7x1.7 hole 1: 2(2.54,0) 3(0,-2.54) 4(2.54,-2.54) 5(0,-5.08) 6(2.54,-5.08) 7(0,-7.62) 8(2.54,-7.62) 9(0,-10.16) 10(2.54,-10.16) 11(0,-12.7) 12(2.54,-12.7) 13(0,-15.24) 14(2.54,-15.24) 15(0,-17.78) 16(2.54,-17.78) 17(0,-20.32) 18(2.54,-20.32) 19(0,-22.86) 20(2.54,-22.86) 21(0,-25.4) 22(2.54,-25.4)
F.SilkS:
  lines w0.12: -1.33,0 -1.33,1.33 0,1.33 ; -1.33,-26.73 3.87,-26.73 3.87,1.33 1.27,1.33 1.27,-1.27 -1.33,-1.27 -1.33,-26.73
F.CrtYd:
  lines w0.05: -1.8,-27.2 -1.8,1.8 4.35,1.8 4.35,-27.2 -1.8,-27.2
F.Fab:
  lines w0.1: -1.27,-26.67 3.81,-26.67 3.81,1.27 0,1.27 -1.27,0 -1.27,-26.67
  text "'.Designator'" at 2.11,-16.747 h1

## PinHeader_2x11_P2.54mm_Vertical_SMD [mm]
pads (22):
  rect 3.15x1 smd: 1(-2.525,12.7) 2(2.525,12.7) 3(-2.525,10.16) 4(2.525,10.16) 5(-2.525,7.62) 6(2.525,7.62) 7(-2.525,5.08) 8(2.525,5.08) 9(-2.525,2.54) 10(2.525,2.54) 11(-2.525,0) 12(2.525,0) 13(-2.525,-2.54) 14(2.525,-2.54) 15(-2.525,-5.08) 16(2.525,-5.08) 17(-2.525,-7.62) 18(2.525,-7.62) 19(-2.525,-10.16) 20(2.525,-10.16) 21(-2.525,-12.7) 22(2.525,-12.7)
F.SilkS:
  lines w0.12: -4.04,13.46 -2.6,13.46 -2.6,14.03 2.6,14.03 2.6,13.46 ; -2.6,-13.46 -2.6,-14.03 2.6,-14.03 2.6,-13.46 ; -2.6,-11.94 -2.6,-10.92 ; -2.6,-9.4 -2.6,-8.38 ; -2.6,-6.86 -2.6,-5.84 ; -2.6,-4.32 -2.6,-3.3 ; -2.6,-1.78 -2.6,-0.76 ; -2.6,0.76 -2.6,1.78 ; -2.6,3.3 -2.6,4.32 ; -2.6,5.84 -2.6,6.86 ; -2.6,8.38 -2.6,9.4 ; -2.6,10.92 -2.6,11.94 ; 2.6,-11.94 2.6,-10.92 ; 2.6,-9.4 2.6,-8.38 ; 2.6,-6.86 2.6,-5.84 ; 2.6,-4.32 2.6,-3.3 ; 2.6,-1.78 2.6,-0.76 ; 2.6,0.76 2.6,1.78 ; 2.6,3.3 2.6,4.32 ; 2.6,5.84 2.6,6.86 ; 2.6,8.38 2.6,9.4 ; 2.6,10.92 2.6,11.94
F.CrtYd:
  lines w0.05: -5.9,-14.5 -5.9,14.5 5.9,14.5 5.9,-14.5 -5.9,-14.5
F.Fab:
  lines w0.1: -2.54,-13.02 -3.6,-13.02 -3.6,-12.38 -2.54,-12.38 ; -2.54,-10.48 -3.6,-10.48 -3.6,-9.84 -2.54,-9.84 ; -2.54,-7.94 -3.6,-7.94 -3.6,-7.3 -2.54,-7.3 ; -2.54,-5.4 -3.6,-5.4 -3.6,-4.76 -2.54,-4.76 ; -2.54,-2.86 -3.6,-2.86 -3.6,-2.22 -2.54,-2.22 ; -2.54,-0.32 -3.6,-0.32 -3.6,0.32 -2.54,0.32 ; -2.54,2.22 -3.6,2.22 -3.6,2.86 -2.54,2.86 ; -2.54,4.76 -3.6,4.76 -3.6,5.4 -2.54,5.4 ; -2.54,7.3 -3.6,7.3 -3.6,7.94 -2.54,7.94 ; -2.54,9.84 -3.6,9.84 -3.6,10.48 -2.54,10.48 ; -2.54,12.38 -3.6,12.38 -3.6,13.02 -2.54,13.02 ; 2.54,-13.02 3.6,-13.02 3.6,-12.38 2.54,-12.38 ; 2.54,-10.48 3.6,-10.48 3.6,-9.84 2.54,-9.84 ; 2.54,-7.94 3.6,-7.94 3.6,-7.3 2.54,-7.3 ; 2.54,-5.4 3.6,-5.4 3.6,-4.76 2.54,-4.76 ; 2.54,-2.86 3.6,-2.86 3.6,-2.22 2.54,-2.22 ; 2.54,-0.32 3.6,-0.32 3.6,0.32 2.54,0.32 ; 2.54,2.22 3.6,2.22 3.6,2.86 2.54,2.86 ; 2.54,4.76 3.6,4.76 3.6,5.4 2.54,5.4 ; 2.54,7.3 3.6,7.3 3.6,7.94 2.54,7.94 ; 2.54,9.84 3.6,9.84 3.6,10.48 2.54,10.48 ; 2.54,12.38 3.6,12.38 3.6,13.02 2.54,13.02 ; -2.54,13.02 -2.54,-13.97 2.54,-13.97 2.54,13.97 -1.59,13.97 -2.54,13.02
  text "'.Designator'" at 0.84,-4.047 h1

## PinHeader_2x12_P2.54mm_Horizontal [mm]
pads (24):
  rect 1.7x1.7 hole 1: 1(0,0)
  rrect100% 1.7x1.7 hole 1: 2(2.54,0) 3(0,-2.54) 4(2.54,-2.54) 5(0,-5.08) 6(2.54,-5.08) 7(0,-7.62) 8(2.54,-7.62) 9(0,-10.16) 10(2.54,-10.16) 11(0,-12.7) 12(2.54,-12.7) 13(0,-15.24) 14(2.54,-15.24) 15(0,-17.78) 16(2.54,-17.78) 17(0,-20.32) 18(2.54,-20.32) 19(0,-22.86) 20(2.54,-22.86) 21(0,-25.4) 22(2.54,-25.4) 23(0,-27.94) 24(2.54,-27.94)
F.SilkS:
  lines w0.12: -1.27,0 -1.27,1.27 0,1.27 ; 1.043,-28.32 1.497,-28.32 ; 1.043,-27.56 1.497,-27.56 ; 1.043,-25.78 1.497,-25.78 ; 1.043,-25.02 1.497,-25.02 ; 1.043,-23.24 1.497,-23.24 ; 1.043,-22.48 1.497,-22.48 ; 1.043,-20.7 1.497,-20.7 ; 1.043,-19.94 1.497,-19.94 ; 1.043,-18.16 1.497,-18.16 ; 1.043,-17.4 1.497,-17.4 ; 1.043,-15.62 1.497,-15.62 ; 1.043,-14.86 1.497,-14.86 ; 1.043,-13.08 1.497,-13.08 ; 1.043,-12.32 1.497,-12.32 ; 1.043,-10.54 1.497,-10.54 ; 1.043,-9.78 1.497,-9.78 ; 1.043,-8 1.497,-8 ; 1.043,-7.24 1.497,-7.24 ; 1.043,-5.46 1.497,-5.46 ; 1.043,-4.7 1.497,-4.7 ; 1.043,-2.92 1.497,-2.92 ; 1.043,-2.16 1.497,-2.16 ; 1.11,-0.38 1.497,-0.38 ; 1.11,0.38 1.497,0.38 ; 3.583,-28.32 3.98,-28.32 ; 3.583,-27.56 3.98,-27.56 ; 3.583,-25.78 3.98,-25.78 ; 3.583,-25.02 3.98,-25.02 ; 3.583,-23.24 3.98,-23.24 ; 3.583,-22.48 3.98,-22.48 ; 3.583,-20.7 3.98,-20.7 ; 3.583,-19.94 3.98,-19.94 ; 3.583,-18.16 3.98,-18.16 ; 3.583,-17.4 3.98,-17.4 ; 3.583,-15.62 3.98,-15.62 ; 3.583,-14.86 3.98,-14.86 ; 3.583,-13.08 3.98,-13.08 ; 3.583,-12.32 3.98,-12.32 ; 3.583,-10.54 3.98,-10.54 ; 3.583,-9.78 3.98,-9.78 ; 3.583,-8 3.98,-8 ; 3.583,-7.24 3.98,-7.24 ; 3.583,-5.46 3.98,-5.46 ; 3.583,-4.7 3.98,-4.7 ; 3.583,-2.92 3.98,-2.92 ; 3.583,-2.16 3.98,-2.16 ; 3.583,-0.38 3.98,-0.38 ; 3.583,0.38 3.98,0.38 ; 3.98,-26.67 6.64,-26.67 ; 3.98,-24.13 6.64,-24.13 ; 3.98,-21.59 6.64,-21.59 ; 3.98,-19.05 6.64,-19.05 ; 3.98,-16.51 6.64,-16.51 ; 3.98,-13.97 6.64,-13.97 ; 3.98,-11.43 6.64,-11.43 ; 3.98,-8.89 6.64,-8.89 ; 3.98,-6.35 6.64,-6.35 ; 3.98,-3.81 6.64,-3.81 ; 3.98,-1.27 6.64,-1.27 ; 6.64,-28.32 12.64,-28.32 12.64,-27.56 6.64,-27.56 ; 6.64,-25.78 12.64,-25.78 12.64,-25.02 6.64,-25.02 ; 6.64,-23.24 12.64,-23.24 12.64,-22.48 6.64,-22.48 ; 6.64,-20.7 12.64,-20.7 12.64,-19.94 6.64,-19.94 ; 6.64,-18.16 12.64,-18.16 12.64,-17.4 6.64,-17.4 ; 6.64,-15.62 12.64,-15.62 12.64,-14.86 6.64,-14.86 ; 6.64,-13.08 12.64,-13.08 12.64,-12.32 6.64,-12.32 ; 6.64,-10.54 12.64,-10.54 12.64,-9.78 6.64,-9.78 ; 6.64,-8 12.64,-8 12.64,-7.24 6.64,-7.24 ; 6.64,-5.46 12.64,-5.46 12.64,-4.7 6.64,-4.7 ; 6.64,-2.92 12.64,-2.92 12.64,-2.16 6.64,-2.16 ; 6.64,-0.38 12.64,-0.38 12.64,0.38 6.64,0.38 ; 6.64,-0.28 12.64,-0.28 ; 6.64,-0.16 12.64,-0.16 ; 6.64,-0.04 12.64,-0.04 ; 6.64,0.08 12.64,0.08 ; 6.64,0.2 12.64,0.2 ; 6.64,0.32 12.64,0.32 ; 3.98,-29.27 3.98,1.33 6.64,1.33 6.64,-29.27 3.98,-29.27
F.CrtYd:
  lines w0.05: -1.8,-29.75 -1.8,1.8 13.1,1.8 13.1,-29.75 -1.8,-29.75
F.Fab:
  lines w0.1: 4.04,-28.26 -0.32,-28.26 -0.32,-27.62 4.04,-27.62 ; 4.04,-25.72 -0.32,-25.72 -0.32,-25.08 4.04,-25.08 ; 4.04,-23.18 -0.32,-23.18 -0.32,-22.54 4.04,-22.54 ; 4.04,-20.64 -0.32,-20.64 -0.32,-20 4.04,-20 ; 4.04,-18.1 -0.32,-18.1 -0.32,-17.46 4.04,-17.46 ; 4.04,-15.56 -0.32,-15.56 -0.32,-14.92 4.04,-14.92 ; 4.04,-13.02 -0.32,-13.02 -0.32,-12.38 4.04,-12.38 ; 4.04,-10.48 -0.32,-10.48 -0.32,-9.84 4.04,-9.84 ; 4.04,-7.94 -0.32,-7.94 -0.32,-7.3 4.04,-7.3 ; 4.04,-5.4 -0.32,-5.4 -0.32,-4.76 4.04,-4.76 ; 4.04,-2.86 -0.32,-2.86 -0.32,-2.22 4.04,-2.22 ; 4.04,-0.32 -0.32,-0.32 -0.32,0.32 4.04,0.32 ; 6.58,-28.26 12.58,-28.26 12.58,-27.62 6.58,-27.62 ; 6.58,-25.72 12.58,-25.72 12.58,-25.08 6.58,-25.08 ; 6.58,-23.18 12.58,-23.18 12.58,-22.54 6.58,-22.54 ; 6.58,-20.64 12.58,-20.64 12.58,-20 6.58,-20 ; 6.58,-18.1 12.58,-18.1 12.58,-17.46 6.58,-17.46 ; 6.58,-15.56 12.58,-15.56 12.58,-14.92 6.58,-14.92 ; 6.58,-13.02 12.58,-13.02 12.58,-12.38 6.58,-12.38 ; 6.58,-10.48 12.58,-10.48 12.58,-9.84 6.58,-9.84 ; 6.58,-7.94 12.58,-7.94 12.58,-7.3 6.58,-7.3 ; 6.58,-5.4 12.58,-5.4 12.58,-4.76 6.58,-4.76 ; 6.58,-2.86 12.58,-2.86 12.58,-2.22 6.58,-2.22 ; 6.58,-0.32 12.58,-0.32 12.58,0.32 6.58,0.32 ; 4.04,-29.21 4.04,0.635 4.675,1.27 6.58,1.27 6.58,-29.21 4.04,-29.21
  text "'.Designator'" at 6.15,-18.017 h1